# Altium footprint library 769BI_LTDC.PcbLib: 51 footprints (part 4 of 4)
Each footprint in its own frame and in the unit in brackets; x right, y up, seen from the top. Pads: shape width x height; smd on the part's side, far side on the other; paste and mask are expansions set on the pad; w line width, h text height; cw(c..) or ccw(c..) is an arc to the next point about the centre after c.
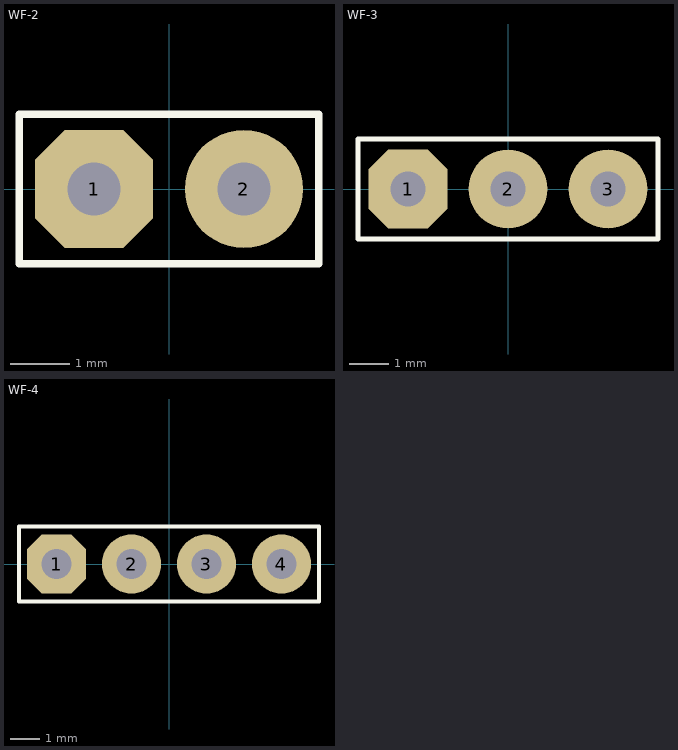
[diagram p3: the footprints below, top view; thin cyan lines are the x and y axes]

## WF-2 [mm]
pads (2):
  oct 2x2 hole 0.9: 1(-1.27,0)
  round 2 hole 0.9: 2(1.27,0)
Top Overlay:
  lines w0.127: -2.54,-1.27 -2.54,1.27 2.54,1.27 2.54,-1.27 -2.54,-1.27
3D body "HN-1x2.STEP": height 10.1, standoff -1.5, extent -2.54,-1.27 2.54,1.27
3D body "User Library-WF-2.step": height 11.73, standoff -2.55, extent -2.6,-3.225 2.6,2.675

## WF-3 [mm]
pads (3):
  oct 2x2 hole 0.9: 1(-2.54,0)
  round 2 hole 0.9: 2(0,0) 3(2.54,0)
Top Overlay:
  lines w0.127: -3.81,-1.27 -3.81,1.27 3.81,1.27 3.81,-1.27 -3.81,-1.27
3D body "HN-1x3.STEP": height 10.1, standoff -1.5, extent -3.81,-1.27 3.81,1.27
3D body "User Library-WF-3.step": height 11.73, standoff -3, extent -3.9,-3.2 3.9,2.7

## WF-4 [mm]
pads (4):
  oct 2x2 hole 1: 1(-3.81,0)
  round 2 hole 1: 2(-1.27,0) 3(1.27,0) 4(3.81,0)
Top Overlay:
  lines w0.127: -5.08,-1.27 -5.08,1.27 5.08,1.27 5.08,-1.27 -5.08,-1.27
3D body "HN-1x4.STEP": height 10.1, standoff -1.5, extent -5.08,-1.27 5.08,1.27
3D body "User Library-WF-4.step": height 11.73, standoff -2.55, extent -5.08,-3.2 5.08,2.7